# Altium footprint library Footprints.PcbLib: 207 footprints (part 8 of 13)
Each footprint in its own frame and in the unit in brackets; x right, y up, seen from the top. Pads: shape width x height; smd on the part's side, far side on the other; paste and mask are expansions set on the pad; w line width, h text height; cw(c..) or ccw(c..) is an arc to the next point about the centre after c.
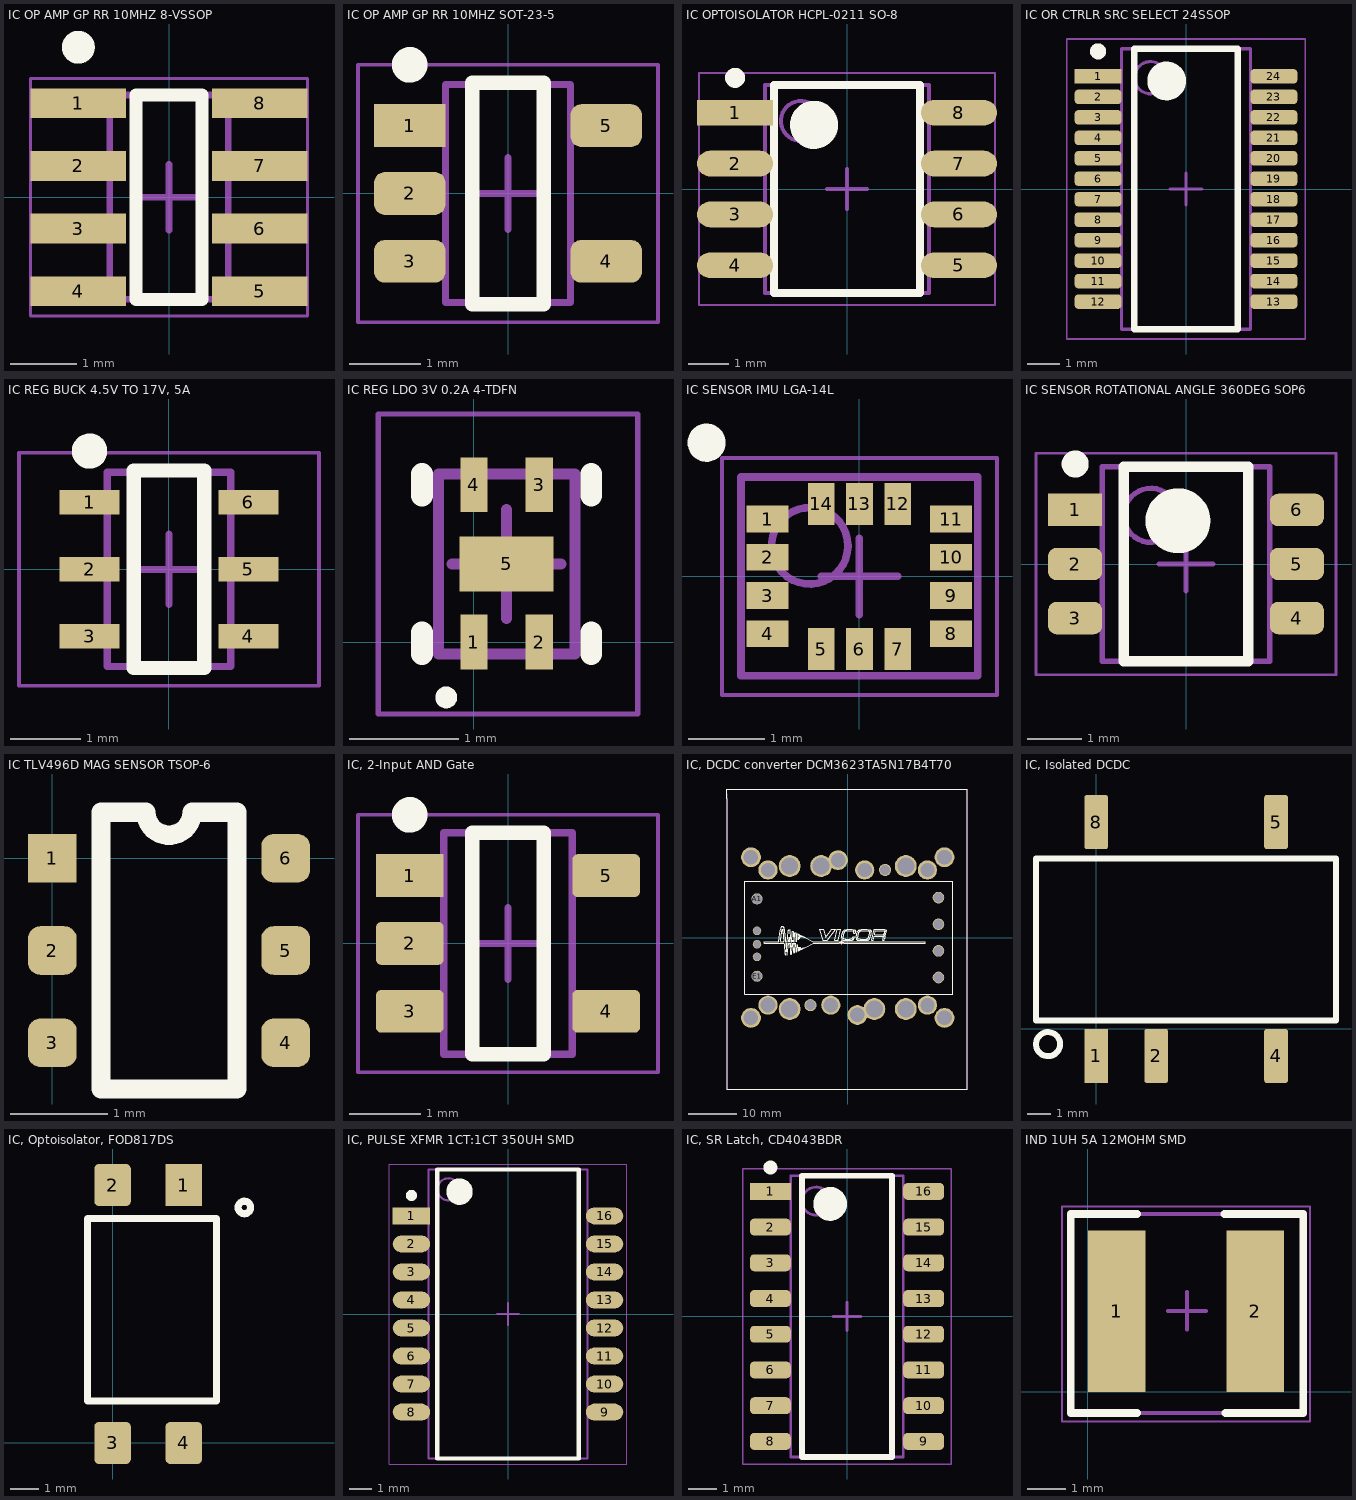
[diagram p7: the footprints below, top view; thin cyan lines are the x and y axes]

## IC OP AMP GP RR 10MHZ 8-VSSOP [mm] "General Purpose Amplifier 2 Circuit Rail-to-Rail 8-VSSOP"
height 1.45
pads (8):
  rect 1.45x0.45 smd: 1(-1.375,1.425) 2(-1.375,0.475) 3(-1.375,-0.475) 4(-1.375,-1.425) 5(1.375,-1.425) 6(1.375,-0.475) 7(1.375,0.475) 8(1.375,1.425)
Top Overlay:
  circle w0.25: c-1.375,2.275 r0.125
  lines w0.2: -0.5,-1.55 0.5,-1.55 0.5,1.55 -0.5,1.55 -0.5,-1.55
Mechanical 13:
  lines w0.1: -0.9,-1.55 0.9,-1.55 0.9,1.55 -0.9,1.55 -0.9,-1.55
Mechanical 15:
  lines w0.05: -2.1,-1.8 2.1,-1.8 2.1,1.8 -2.1,1.8 -2.1,-1.8
  lines w0.1: -0.5,0 0.5,0 ; 0,-0.5 0,0.5
3D body "IC OP AMP GP RR 10MHZ 8-VSSOP  .step": height 1.45, standoff 0.01, extent -1.393,-1.625 1.393,1.625

## IC OP AMP GP RR 10MHZ SOT-23-5 [mm] "SOT23, 5-Leads, Body 2.90x2.80mm, Pitch 0.95mm, IPC Medium Density"
height 1.45
pads (5):
  rect 1x0.6 smd: 1(-1.375,0.95)
  rrect50% 1x0.6 smd: 2(-1.375,0) 3(-1.375,-0.95) 4(1.375,-0.95) 5(1.375,0.95)
Top Overlay:
  circle w0.25: c-1.375,1.8 r0.125
  lines w0.2: -0.5,-1.55 -0.5,1.55 0.5,1.55 0.5,-1.55 -0.5,-1.55
Mechanical 13:
  lines w0.1: -0.875,-1.525 0.875,-1.525 0.875,1.525 -0.875,1.525 -0.875,-1.525
Mechanical 15:
  lines w0.05: -2.1,-1.8 2.1,-1.8 2.1,1.8 -2.1,1.8 -2.1,-1.8
  lines w0.1: -0.5,0 0.5,0 ; 0,-0.5 0,0.5
3D body "IC OP AMP GP RR 10MHZ SOT-23-5.step": height 1.45, standoff 0, extent -1.5,-1.525 1.5,1.525

## IC OPTOISOLATOR HCPL-0211 SO-8 [mm] "SOIC, 8-Leads, Body 5.08x3.94mm, Pitch 1.27mm, IPC Medium Density"
height 3.2
pads (8):
  rect 1.9x0.64 smd: 1(-2.795,1.905)
  oval 1.9x0.64 smd: 2(-2.795,0.635) 3(-2.795,-0.635) 4(-2.795,-1.905) 5(2.795,-1.905) 6(2.795,-0.635) 7(2.795,0.635) 8(2.795,1.905)
Top Overlay:
  circle w0.6: c-0.825,1.6 r0.3
  circle w0.25: c-2.795,2.775 r0.125
  lines w0.2: -1.825,-2.6 1.825,-2.6 1.825,2.6 -1.825,2.6 -1.825,-2.6
Assembly Top:
  circle w0.1: c-1.15,1.7 r0.5
  lines w0.1: -2.05,-2.6 2.05,-2.6 2.05,2.6 -2.05,2.6 -2.05,-2.6
Courtyard Top:
  lines w0.05: -3.7,-2.9 3.7,-2.9 3.7,2.9 -3.7,2.9 -3.7,-2.9
  lines w0.1: -0.5,0 0.5,0 ; 0,-0.5 0,0.5
3D body "IC OPTOISOLATOR HCPL-0211 SO-8.step": height 3.2, standoff 0, extent -2.997,-2.6 2.997,2.6

## IC OR CTRLR SRC SELECT 24SSOP [mm] "LTC4417"
height 1.75
pads (24):
  rect 1.45x0.45 smd: 1(-2.725,3.492)
  rrect50% 1.45x0.45 smd: 2(-2.725,2.857) 3(-2.725,2.222) 4(-2.725,1.587) 5(-2.725,0.953) 6(-2.725,0.318) 7(-2.725,-0.318) 8(-2.725,-0.953) 9(-2.725,-1.587) 10(-2.725,-2.222) 11(-2.725,-2.857) 12(-2.725,-3.492) 13(2.725,-3.492) 14(2.725,-2.857) 15(2.725,-2.222) 16(2.725,-1.587) 17(2.725,-0.953) 18(2.725,-0.318) 19(2.725,0.318) 20(2.725,0.953) 21(2.725,1.587) 22(2.725,2.222) 23(2.725,2.857) 24(2.725,3.492)
Top Overlay:
  circle w0.6: c-0.6,3.35 r0.3
  circle w0.25: c-2.725,4.267 r0.125
  lines w0.2: -1.6,-4.35 1.6,-4.35 1.6,4.35 -1.6,4.35 -1.6,-4.35
Mechanical 13:
  circle w0.1: c-1.1,3.45 r0.5
  lines w0.1: -2,-4.35 2,-4.35 2,4.35 -2,4.35 -2,-4.35
Mechanical 15:
  lines w0.05: -3.7,-4.65 3.7,-4.65 3.7,4.65 -3.7,4.65 -3.7,-4.65
  lines w0.1: -0.5,0 0.5,0 ; 0,-0.5 0,0.5
3D body "IC OR CTRLR SRC SELECT 24SSOP.step": height 1.75, standoff 0, extent -3.004,-4.35 3.004,4.35

## IC REG BUCK 4.5V TO 17V, 5A [mm] "Buck Switching Regulator IC Positive Adjustable 0.6V 1 Output 5A SOT-23-6 Thin, TSOT-23-6"
height 1.1
pads (6):
  rect 0.85x0.35 smd: 1(-1.125,0.95) 2(-1.125,0) 3(-1.125,-0.95) 4(1.125,-0.95) 5(1.125,0) 6(1.125,0.95)
Top Overlay:
  circle w0.25: c-1.125,1.675 r0.125
  lines w0.2: -0.5,-1.4 -0.5,1.4 0.5,1.4 0.5,-1.4 -0.5,-1.4
Assembly Top:
  lines w0.1: -0.875,-1.375 0.875,-1.375 0.875,1.375 -0.875,1.375 -0.875,-1.375
Courtyard Top:
  lines w0.05: -2.125,-1.65 2.125,-1.65 2.125,1.65 -2.125,1.65 -2.125,-1.65
  lines w0.1: -0.5,0 0.5,0 ; 0,-0.5 0,0.5
3D body "IC REG BUCK 4.5V TO 17V, 5A.step": height 1.1, standoff 0, extent -1.525,-1.375 1.525,1.375

## IC REG LDO 3V 0.2A 4-TDFN [mm] "QFN, 4-Leads, Body 1.20x1.60mm, Pitch 0.50mm/1.40mm, Thermal Pad 0.86x0.50mm, IPC Medium Density"
height 0.6
pads (5):
  rect 0.25x0.5 smd: 1(0,0) 2(0.6,0) 3(0.6,1.44) 4(0,1.44)
  rect 0.86x0.5 smd: 5(0.3,0.715)
Top Overlay:
  circle w0.1: c-0.254,-0.508 r0.05
  lines w0.2: -0.475,-0.11 -0.475,0.09 ; -0.475,1.34 -0.475,1.54 ; 1.075,-0.11 1.075,0.09 ; 1.075,1.34 1.075,1.54
Mechanical 13:
  lines w0.1: -0.325,-0.11 0.925,-0.11 0.925,1.54 -0.325,1.54 -0.325,-0.11
Mechanical 15:
  lines w0.05: -0.875,-0.66 1.5,-0.66 1.5,2.09 -0.875,2.09 -0.875,-0.66
  lines w0.1: -0.2,0.715 0.8,0.715 ; 0.3,0.215 0.3,1.215
3D body "IC REG LDO 3V 0.2A 4-TDFN.step": height 0.6, standoff 0, extent -0.325,-0.111 0.925,1.541

## IC SENSOR IMU LGA-14L [mm] "PQFN, 14-Leads, Body 3.00x2.50mm, Pitch 0.50mm, IPC Medium Density"
height 0.86
pads (14):
  rect 0.55x0.35 smd: 1(-1.2,0.75) 2(-1.2,0.25) 3(-1.2,-0.25) 4(-1.2,-0.75) 8(1.2,-0.75) 9(1.2,-0.25) 10(1.2,0.25) 11(1.2,0.75)
  rect 0.35x0.55 smd: 5(-0.5,-0.95) 6(0,-0.95) 7(0.5,-0.95) 12(0.5,0.95) 13(0,0.95) 14(-0.5,0.95)
Top Overlay:
  circle w0.25: c-2,1.75 r0.125
Mechanical 13:
  circle w0.1: c-0.65,0.4 r0.5
  lines w0.1: -1.55,-1.3 -1.55,1.3 1.55,1.3 1.55,-1.3 -1.55,-1.3
Mechanical 15:
  lines w0.05: -1.8,-1.55 -1.8,1.55 1.8,1.55 1.8,-1.55 -1.8,-1.55
  lines w0.1: -0.5,0 0.5,0 ; 0,-0.5 0,0.5
3D body "IC SENSOR IMU LGA-14L.step": height 0.86, standoff 0, extent -1.55,-1.3 1.55,1.3

## IC SENSOR ROTATIONAL ANGLE 360DEG SOP6 [mm] "TSOP, 6-Leads, Body 3.60x3.00mm, Pitch 1.00mm, IPC Medium Density"
height 1.05
pads (6):
  rect 1x0.6 smd: 1(-2.05,1)
  rrect50% 1x0.6 smd: 2(-2.05,0) 3(-2.05,-1) 4(2.05,-1) 5(2.05,0) 6(2.05,1)
Top Overlay:
  circle w0.25: c-2.05,1.85 r0.125
  circle w0.6: c-0.15,0.8 r0.3
  lines w0.2: -1.15,-1.8 -1.15,1.8 1.15,1.8 1.15,-1.8 -1.15,-1.8
Mechanical 13:
  circle w0.1: c-0.65,0.9 r0.5
  lines w0.1: -1.55,-1.8 -1.55,1.8 1.55,1.8 1.55,-1.8 -1.55,-1.8
Mechanical 15:
  lines w0.05: -2.775,-2.05 -2.775,2.05 2.775,2.05 2.775,-2.05 -2.775,-2.05
  lines w0.1: -0.5,0 0.5,0 ; 0,-0.5 0,0.5
3D body "IC SENSOR ROTATIONAL ANGLE 360DEG SOP6.step": height 1.05, standoff 0, extent -2.1,-1.8 2.1,1.8

## IC TLV496D MAG SENSOR TSOP-6 [mm]
pads (6):
  rect 0.5x0.5 smd: 1(0,0)
  rrect50% 0.5x0.5 smd: 2(0,-0.95) 3(0,-1.9) 4(2.4,-1.9) 5(2.4,-0.95) 6(2.4,0)
Top Overlay:
  lines w0.2: 0.5,-2.375 0.5,0.475 0.962,0.475 ccw(c1.2,0.475) 1.438,0.475 1.9,0.475 1.9,-2.375 0.5,-2.375
3D body "User Library-TSOP-6.step": height 1, standoff 0, extent -0.105,-2.44 2.595,0.56

## IC, 2-Input AND Gate [mm] "IC GATE AND 1CH 2-INP 5-SSOP"
height 1.25
pads (5):
  rect 0.95x0.6 smd: 1(-1.375,0.95)
  rrect25% 0.95x0.6 smd: 2(-1.375,0) 3(-1.375,-0.95) 4(1.375,-0.95) 5(1.375,0.95)
Top Overlay:
  circle w0.25: c-1.375,1.8 r0.125
  lines w0.2: -0.5,-1.55 -0.5,1.55 0.5,1.55 0.5,-1.55 -0.5,-1.55
Mechanical 13:
  lines w0.1: -0.9,-1.55 -0.9,1.55 0.9,1.55 0.9,-1.55 -0.9,-1.55
Mechanical 15:
  lines w0.05: -2.1,-1.8 -2.1,1.8 2.1,1.8 2.1,-1.8 -2.1,-1.8
  lines w0.1: -0.5,0 0.5,0 ; 0,-0.5 0,0.5
3D body: height 1.25, standoff 0, extent -0.899,-1.549 0.899,1.549

## IC, DCDC converter DCM3623TA5N17B4T70 [mm]
pads (31):
  round 2.28 hole 2.03: A1(-18.75,8) E1(-18.75,-8)
  round 2.41 hole 2.03: A'2(18.75,8.25) B'2(18.75,2.75) C'2(18.75,-2.75) D'2(18.75,-8.25)
  round 1.77 hole 1.52: B1(-18.75,1.38) C1(-18.75,-1.38) D1(-18.75,-4)
  round 4.1 hole 3: ""(-20,-16.6) ""(-20,16.6) ""(-2,16) ""(2,-16) ""(20,-16.6) ""(20,16.6)
  round 2.5 hole 3.1 unplated: ""(-16.47,-13.97)
  round 3.97 hole 2.95: ""(-16.47,-13.97) ""(-16.47,13.97) ""(-3.5,-13.97) ""(3.5,13.97) ""(16.47,-13.97) ""(16.47,13.97)
  round 4.52 hole 3.5: ""(-12,-14.78) ""(-12,14.78) ""(-12,14.78) ""(-5.5,14.78) ""(5.5,-14.78) ""(12,-14.78) ""(12,14.78)
  round 2.5 hole 2.1: ""(-7.71,-13.97) ""(7.71,13.97)
Top Overlay:
  drawing of 1137 lines, arcs and shapes, not listed
Mechanical 15:
  lines w0.254: 21.75,3.34 21.75,7.34 ; -25,-31.3 -25,29.7 -25,30.7 24.7,30.7 24.7,-31.3 -25,-31.3 ; -21.25,-11.695 -21.25,11.644 21.75,11.644 21.75,-11.695 -21.25,-11.695
3D body: height 8, standoff 0, extent -21.25,-11.695 21.75,11.644

## IC, Isolated DCDC [mm]
pads (5):
  rect 1x2.29 smd: 1(0,-1.15)
  rrect20% 1x2.29 smd: 2(2.54,-1.15) 4(7.62,-1.15) 5(7.62,8.76) 8(0,8.76)
Top Overlay:
  circle w0.254: c-2.04,-0.65 r0.51
  lines w0.254: -2.54,0.35 -2.54,7.22 10.16,7.22 10.16,0.35 -2.54,0.35
3D body: height 7, standoff 0.25, extent -2.539,0.351 10.159,7.219

## IC, Optoisolator, FOD817DS [mm]
pads (4):
  rect 1.3x1.5 smd: 1(2.54,9.2)
  rrect25% 1.3x1.5 smd: 2(0,9.2) 3(0,0) 4(2.54,0)
Top Overlay:
  circle w0.254: c4.7,8.4 r0.224
  lines w0.254: -0.9,1.5 3.7,1.5 3.7,8 -0.9,8 -0.9,1.5
3D body: height 3.5, standoff 0.85, extent -0.899,1.501 3.699,7.999

## IC, PULSE XFMR 1CT:1CT 350UH SMD [mm] "PULSE XFMR 1CT:1CT 350UH SMD"
height 5.9
pads (16):
  rect 1.7x0.76 smd: 1(-4.375,4.445)
  oval 1.7x0.76 smd: 2(-4.375,3.175) 3(-4.375,1.905) 4(-4.375,0.635) 5(-4.375,-0.635) 6(-4.375,-1.905) 7(-4.375,-3.175) 8(-4.375,-4.445) 9(4.375,-4.445) 10(4.375,-3.175) 11(4.375,-1.905) 12(4.375,-0.635) 13(4.375,0.635) 14(4.375,1.905) 15(4.375,3.175) 16(4.375,4.445)
Top Overlay:
  circle w0.25: c-4.375,5.375 r0.125
  circle w0.6: c-2.2,5.55 r0.3
  lines w0.2: -3.2,-6.55 -3.2,6.55 3.2,6.55 3.2,-6.55 -3.2,-6.55
Mechanical 13:
  circle w0.1: c-2.7,5.65 r0.5
  lines w0.1: -3.6,-6.55 -3.6,6.55 3.6,6.55 3.6,-6.55 -3.6,-6.55
Mechanical 15:
  lines w0.05: -5.375,-6.8 -5.375,6.8 5.375,6.8 5.375,-6.8 -5.375,-6.8
  lines w0.1: -0.5,0 0.5,0 ; 0,-0.5 0,0.5
3D body "1CT 350UH SMD.step": height 5.9, standoff 0, extent -4.65,-6.55 4.65,6.55

## IC, SR Latch, CD4043BDR [mm] "SR LATCH"
height 1.75
pads (16):
  rect 1.45x0.6 smd: 1(-2.725,4.445)
  rrect50% 1.45x0.6 smd: 2(-2.725,3.175) 3(-2.725,1.905) 4(-2.725,0.635) 5(-2.725,-0.635) 6(-2.725,-1.905) 7(-2.725,-3.175) 8(-2.725,-4.445) 9(2.725,-4.445) 10(2.725,-3.175) 11(2.725,-1.905) 12(2.725,-0.635) 13(2.725,0.635) 14(2.725,1.905) 15(2.725,3.175) 16(2.725,4.445)
Top Overlay:
  circle w0.25: c-2.725,5.295 r0.125
  circle w0.6: c-0.6,4 r0.3
  lines w0.2: -1.6,-5 -1.6,5 1.6,5 1.6,-5 -1.6,-5
Mechanical 13:
  circle w0.1: c-1.1,4.1 r0.5
  lines w0.1: -2,-5 -2,5 2,5 2,-5 -2,-5
Mechanical 15:
  lines w0.05: -3.7,-5.25 -3.7,5.25 3.7,5.25 3.7,-5.25 -3.7,-5.25
  lines w0.1: -0.5,0 0.5,0 ; 0,-0.5 0,0.5
3D body: height 1.75, standoff 0.1, extent -2,-5 2,5

## IND 1UH 5A 12MOHM SMD [mm] "IND 1UH 5A 12MOHM SMD -Semi-shielded"
pads (2):
  rect 1.5x4.2 smd: 1(0.75,2.1) 2(4.35,2.1)
Top Overlay:
  lines w0.2: 1.275,-0.55 -0.45,-0.55 -0.45,4.625 1.275,4.625 ; 3.55,4.625 5.575,4.625 ; 3.575,-0.55 5.6,-0.55 5.6,4.625
Assembly Top:
  lines w0.1: -0.45,-0.55 -0.45,4.625 5.6,4.625 5.6,-0.55 -0.45,-0.55
Courtyard Top:
  lines w0.05: -0.675,-0.775 -0.675,4.825 5.775,4.825 5.775,-0.775 -0.675,-0.775
  lines w0.1: 2.075,2.1 3.075,2.1 ; 2.575,1.625 2.575,2.6